# Altium footprint library IC_SMD_QUAD.PCBLIB: 113 footprints (part 8 of 8)
Each footprint in its own frame and in the unit in brackets; x right, y up, seen from the top. Pads: shape width x height; smd on the part's side, far side on the other; paste and mask are expansions set on the pad; w line width, h text height; cw(c..) or ccw(c..) is an arc to the next point about the centre after c.
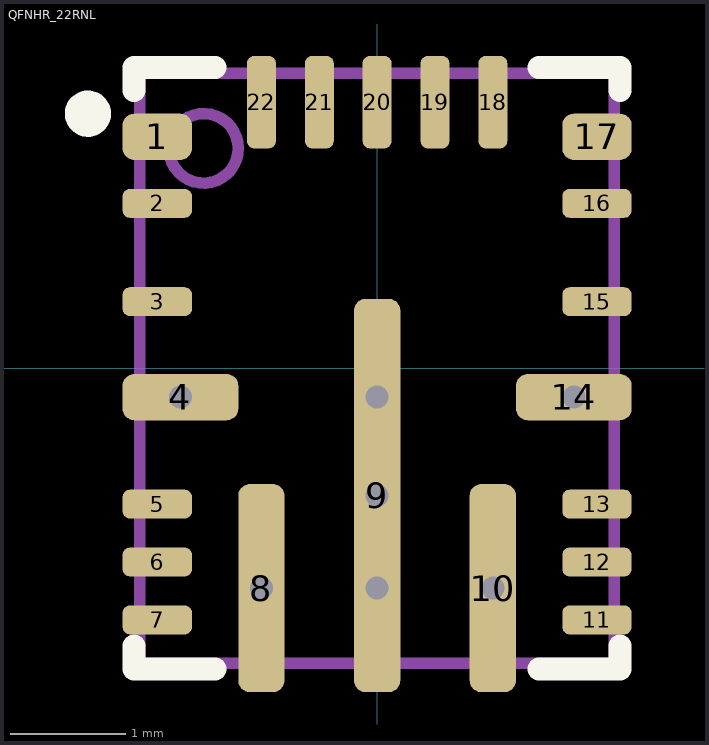
[diagram p7: the footprint, top view; thin cyan lines are the x and y axes]

## QFNHR_22RNL [mm] "VQFN-HR22, RNL, 5X4X0.9mm"
height 0.9
pads (22):
  rrect50% 0.6x0.4 smd paste+0 mask+0.075: 1(-1.9,2) 17(1.9,2)
  rrect50% 0.6x0.25 smd paste+0 mask+0.075: 2(-1.9,1.425) 3(-1.9,0.575) 5(-1.9,-1.175) 6(-1.9,-1.675) 7(-1.9,-2.175) 11(1.9,-2.175) 12(1.9,-1.675) 13(1.9,-1.175) 15(1.9,0.575) 16(1.9,1.425)
  rrect50% 1x0.4 smd paste-0.5 mask+0.075: 4(-1.7,-0.25) 14(1.7,-0.25)
  rrect50% 0.4x1.8 smd paste-0.812 mask+0.075: 8(-1,-1.9) 10(1,-1.9)
  rrect50% 0.4x3.4 smd paste-1.562 mask+0.075: 9(0,-1.1)
  rrect50% 0.25x0.8 smd paste+0 mask+0.075: 18(1,2.3) 19(0.5,2.3) 20(0,2.3) 21(-0.5,2.3) 22(-1,2.3)
via 1.7,-0.25 diameter 0.4 hole 0.2
via -1.7,-0.25 diameter 0.4 hole 0.2
via -1,-1.9 diameter 0.4 hole 0.2
via 1,-1.9 diameter 0.4 hole 0.2
via 0,-1.9 diameter 0.4 hole 0.2
via 0,-0.25 diameter 0.4 hole 0.2
via 0,-1.1 diameter 0.4 hole 0.2
TopOverlay:
  circle w0.2: c-2.5,2.2 r0.1
  lines w0.2: -2.1,-2.4 -2.1,-2.6 -1.4,-2.6 ; -2.1,2.4 -2.1,2.6 -1.4,2.6 ; 1.4,-2.6 2.1,-2.6 2.1,-2.4 ; 1.4,2.6 2.1,2.6 2.1,2.4
TopPaste:
  drawing of 12 lines, arcs and shapes, not listed
Mechanical13:
  circle w0.1: c-1.5,1.9 r0.3
  lines w0.1: -2.05,-2.55 -2.05,2.55 2.05,2.55 2.05,-2.55 -2.05,-2.55
3D body: height 0.25, standoff 0, extent 0,0 0.254,0.254
3D body "RNL0022A.stp": height 0.9, standoff 0, extent -2,-2.5 2,2.5